# Altium footprint library LUMI_Handy_Soldering_LIB.PcbLib: 562 footprints (part 19 of 36)
Each footprint in its own frame and in the unit in brackets; x right, y up, seen from the top. Pads: shape width x height; smd on the part's side, far side on the other; paste and mask are expansions set on the pad; w line width, h text height; cw(c..) or ccw(c..) is an arc to the next point about the centre after c.
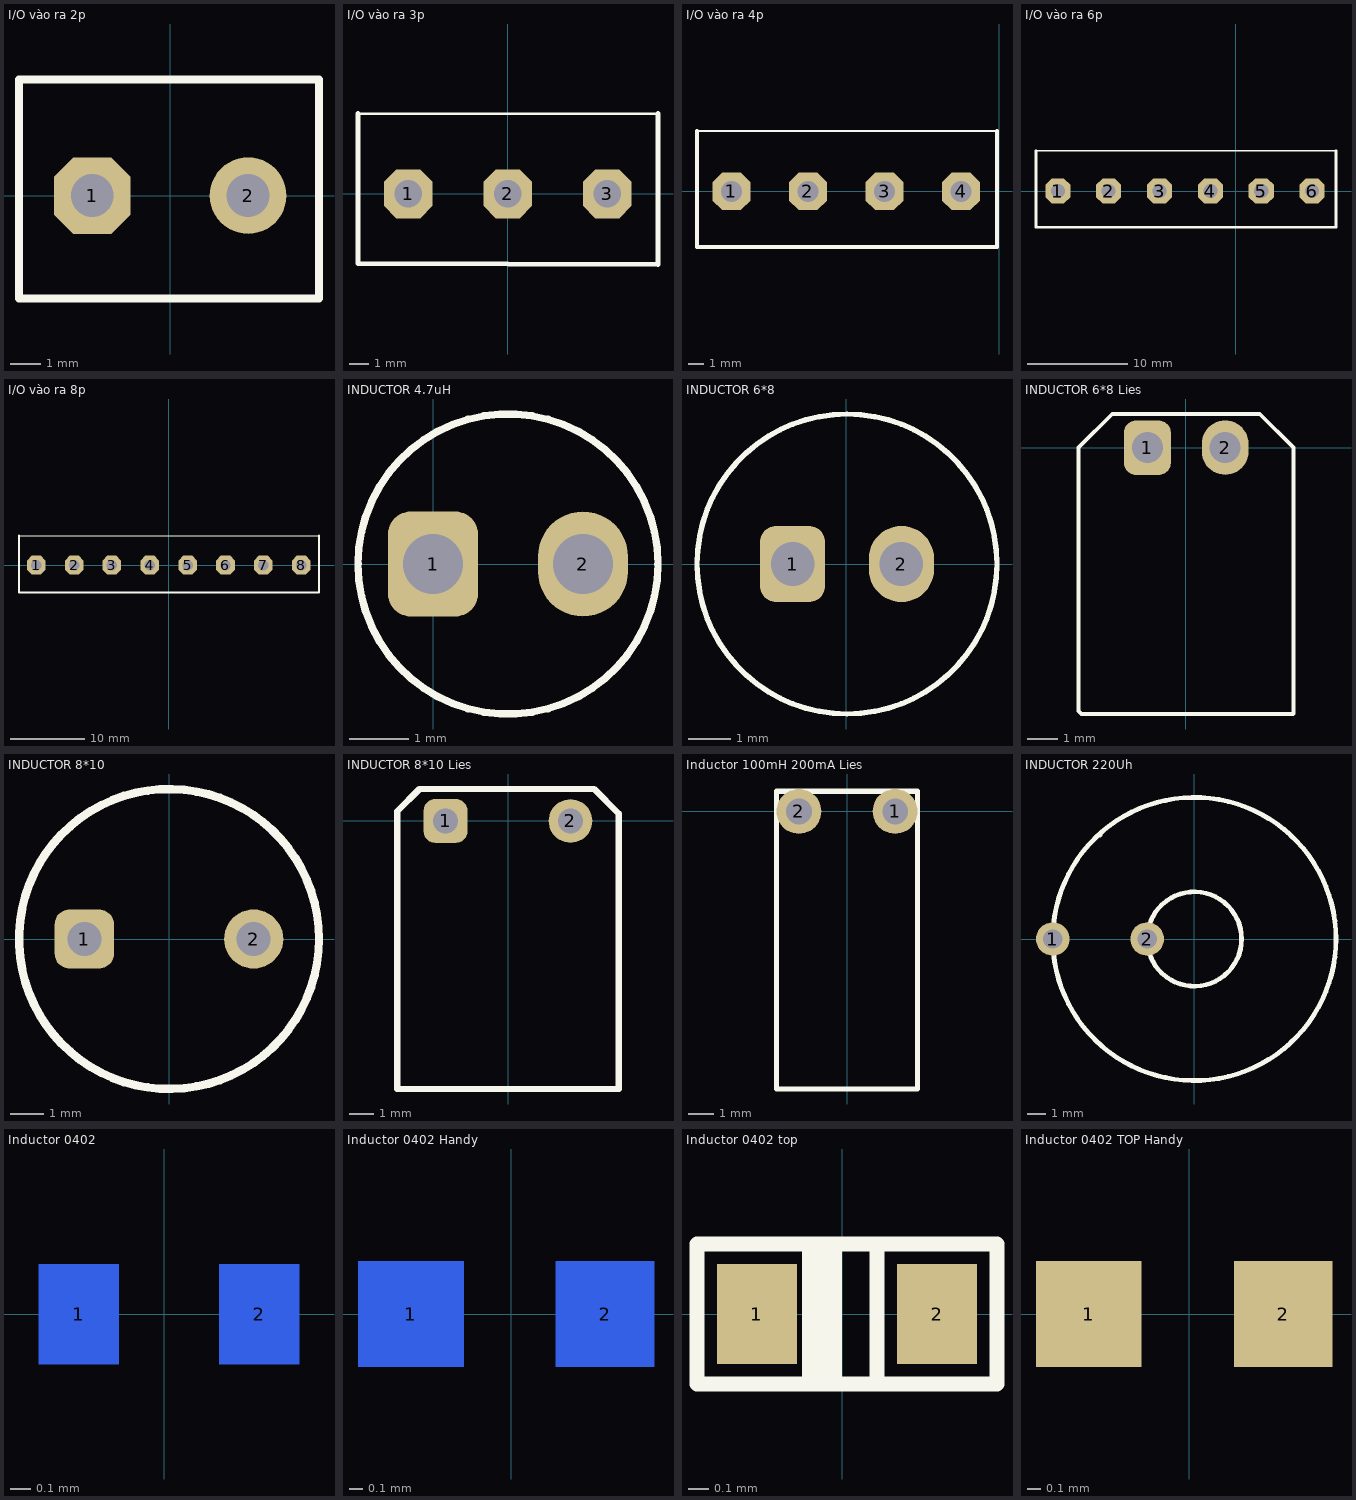
[diagram p18: the footprints below, top view; thin cyan lines are the x and y axes]

## I/O vào ra 2p [mm]
pads (2):
  oct 2.5x2.5 hole 1.397: 1(-2.54,0)
  round 2.5 hole 1.397: 2(2.54,0)
Top Overlay:
  lines w0.254: -4.928,-3.353 4.851,-3.353 4.851,3.785 -4.928,3.785 -4.928,-3.353
3D body: height 10, standoff -4, extent -5.055,-3.505 4.945,3.995

## I/O vào ra 3p [mm] "hkgvh"
pads (3):
  oct 2.5x2.5 hole 1.4: 1(-5.08,0) 2(0,0) 3(5.08,0)
Top Overlay:
  lines w0.15: -7.645,4.089 7.671,4.089
  lines w0.254: -7.645,4.089 -7.645,-3.548 7.671,-3.596 7.671,4.089
3D body: height 10, standoff -4, extent -7.475,-3.436 7.525,4.064

## I/O vào ra 4p [mm] "hkgvh"
pads (4):
  oct 2.5x2.5 hole 1.4: 1(-17.78,0) 2(-12.7,0) 3(-7.62,0) 4(-2.54,0)
Top Overlay:
  lines w0.15: -20.066,4.013 -0.152,4.013
  lines w0.254: -20.066,4.013 -20.066,0.86 -20.066,-0.111 -20.066,-1.206 -20.066,-3.697 -0.279,-3.697 -0.279,-3.683 -0.152,-3.683 -0.152,4.013
3D body: height 10, standoff -4, extent -10.156,-3.531 -0.156,3.969
3D body: height 10, standoff -4, extent -20.033,-3.531 -10.033,3.969

## I/O vào ra 6p [mm] "hkgvh"
pads (6):
  oct 2.5x2.5 hole 1.4: 1(-17.78,0) 2(-12.7,0) 3(-7.62,0) 4(-2.54,0) 5(2.54,0) 6(7.62,0)
Top Overlay:
  lines w0.15: -19.964,4.013 10.008,4.013
  lines w0.254: -19.964,4.013 -19.964,-3.607 10.008,-3.607 10.008,4.013
3D body: height 10, standoff -4, extent -0.127,-3.538 9.873,3.962
3D body: height 10, standoff -4, extent -10.004,-3.538 -0.004,3.962
3D body: height 10, standoff -4, extent -19.881,-3.563 -9.881,3.937

## I/O vào ra 8p [mm] "hkgvh"
pads (8):
  oct 2.5x2.5 hole 1.4: 1(-17.78,0) 2(-12.7,0) 3(-7.62,0) 4(-2.54,0) 5(2.54,0) 6(7.62,0) 7(12.7,0) 8(17.78,0)
Top Overlay:
  lines w0.15: -20.091,3.962 20.168,3.962
  lines w0.254: -20.091,3.962 -20.091,-3.683 20.168,-3.683 20.168,3.962
3D body: height 10, standoff -4, extent 9.884,-3.588 19.884,3.912
3D body: height 10, standoff -4, extent -0.047,-3.588 9.953,3.912
3D body: height 10, standoff -4, extent -9.978,-3.512 0.022,3.988
3D body: height 10, standoff -4, extent -19.884,-3.563 -9.884,3.937

## INDUCTOR 4.7uH [mil]
pads (2):
  rrect50% 60x70 hole 40: 1(0,0)
  oval 60x70 hole 40: 2(100,0)
Top Overlay:
  circle w5: c50,0 r100
3D body: height 78.74, standoff -118.11, extent 88.29,-11.78 111.82,11.8
3D body: height 78.74, standoff -118.11, extent -11.71,-11.78 11.82,11.8
3D body: height 307.87, standoff 7.87, extent -49.21,-99.8 150.01,99.81

## INDUCTOR 6*8 [mil]
pads (2):
  rrect50% 60x70 hole 40: 1(-49.21,0)
  oval 60x70 hole 40: 2(50.79,0)
Top Overlay:
  circle w5: c0.79,0 r137.8
3D body: height 78.74, standoff -118.11, extent 39.08,-11.78 62.6,11.8
3D body: height 78.74, standoff -118.11, extent -60.92,-11.78 -37.4,11.8
3D body: height 401.57, standoff 7.87, extent -135.91,-137.52 138.59,137.53

## INDUCTOR 6*8 Lies [mil]
pads (2):
  rrect50% 60x70 hole 40: 1(-49.21,0)
  oval 60x70 hole 40: 2(50.79,0)
Top Overlay:
  lines w5: -137.8,-338.58 -133.86,-342.52 137.8,-342.52 138.58,-341.73 138.58,0 95.28,43.31 -94.49,43.31 -137.8,0 -137.8,-338.58
3D body: height 78.74, standoff -118.11, extent 39.08,-11.78 62.6,11.8
3D body: height 78.74, standoff -118.11, extent -60.92,-11.78 -37.4,11.8
3D body: height 275.32, standoff 0.27, extent -133.32,-338.58 141.19,-23.62

## INDUCTOR 8*10 [mil]
pads (2):
  rrect50% 70x70 hole 40: 1(-100,0)
  round 70 hole 40: 2(100,0)
Top Overlay:
  circle w10: c0,0 r177.17
3D body: height 307.87, standoff 7.87, extent -175.76,-176.81 177.17,176.82
3D body: height 78.74, standoff -118.11, extent -111.71,-11.78 -88.18,11.8
3D body: height 78.74, standoff -118.11, extent 88.29,-11.78 111.82,11.8

## INDUCTOR 8*10 Lies [mil]
pads (2):
  rrect50% 70x70 hole 40: 1(-100,0)
  round 70 hole 40: 2(100,0)
Top Overlay:
  lines w10: 137.8,51.18 177.17,11.81 177.17,0 177.17,-429.13 -177.17,-429.13 -177.17,3.94 -177.17,15.75 -141.73,51.18 -137.8,51.18 137.8,51.18 ; 137.8,51.18 137.8,51.18
3D body: height 184.69, standoff -168.94, extent -176.47,-417.32 176.47,-23.62
3D body: height 78.74, standoff -118.11, extent -111.71,-11.78 -88.18,11.8
3D body: height 78.74, standoff -118.11, extent 88.29,-11.78 111.82,11.8

## Inductor 100mH 200mA Lies [mil]
pads (2):
  round 70 hole 40: 1(75,0) 2(-75,0)
Top Overlay:
  lines w7.99: 110,31.5 110,-433.07 -110.24,-433.07 -110.24,31.5 110.24,31.5
3D body: height 220.02, standoff 0.45, extent -105.63,-398.43 113.5,-98.43
3D body: height 50, standoff -50, extent -94.84,-19.96 -55,19.97
3D body: height 50, standoff -50, extent 55.16,-19.96 95,19.97

## INDUCTOR 220Uh [mil]
pads (2):
  round 70 hole 40: 1(-295.28,0) 2(-98.43,0)
Top Overlay:
  circle w10: c0,0 r295.28
  circle w10: c0,0 r98.43
  lines w10: -196.85,216.54 -196.85,216.54

## Inductor 0402 [mm]
pads (2):
  rect 0.4x0.5 smd far side: 1(-0.425,0) 2(0.475,0)
Bottom Overlay:
  rectangle: -0.2,-0.35 0,0.35
  lines w0.076: 0.175,-0.35 0.175,0.35 ; -0.725,-0.35 0.775,-0.35 0.775,0.35 -0.725,0.35 -0.725,-0.35
3D body: height 0.6, standoff 0, extent -0.45,-0.25 0.55,0.25

## Inductor 0402 Handy [mil]
pads (2):
  rect 30x30 smd far side: 1(-28.54,0)
  rect 28x30 smd far side: 2(26.57,0)
3D body: height -16.5, standoff -48, extent -32.48,-15.74 30.52,15.75

## Inductor 0402 top [mm]
pads (2):
  rect 0.4x0.5 smd: 1(-0.425,0) 2(0.475,0)
Top Overlay:
  rectangle: -0.2,-0.35 0,0.35
  lines w0.076: 0.175,-0.35 0.175,0.35 ; -0.725,-0.35 -0.725,0.35 0.775,0.35 0.775,-0.35 -0.725,-0.35
3D body: height 0.6, standoff 0, extent -0.5,-0.25 0.5,0.25

## Inductor 0402 TOP Handy [mil]
pads (2):
  rect 30x30 smd: 1(-28.54,0)
  rect 28x30 smd: 2(26.57,0)
3D body: height 23.62, standoff 0, extent -19.69,-9.69 19.69,10